# Altium footprint library biblioteka_pcb.PcbLib: 184 footprints (part 1 of 12)
Each footprint in its own frame and in the unit in brackets; x right, y up, seen from the top. Pads: shape width x height; smd on the part's side, far side on the other; paste and mask are expansions set on the pad; w line width, h text height; cw(c..) or ccw(c..) is an arc to the next point about the centre after c.
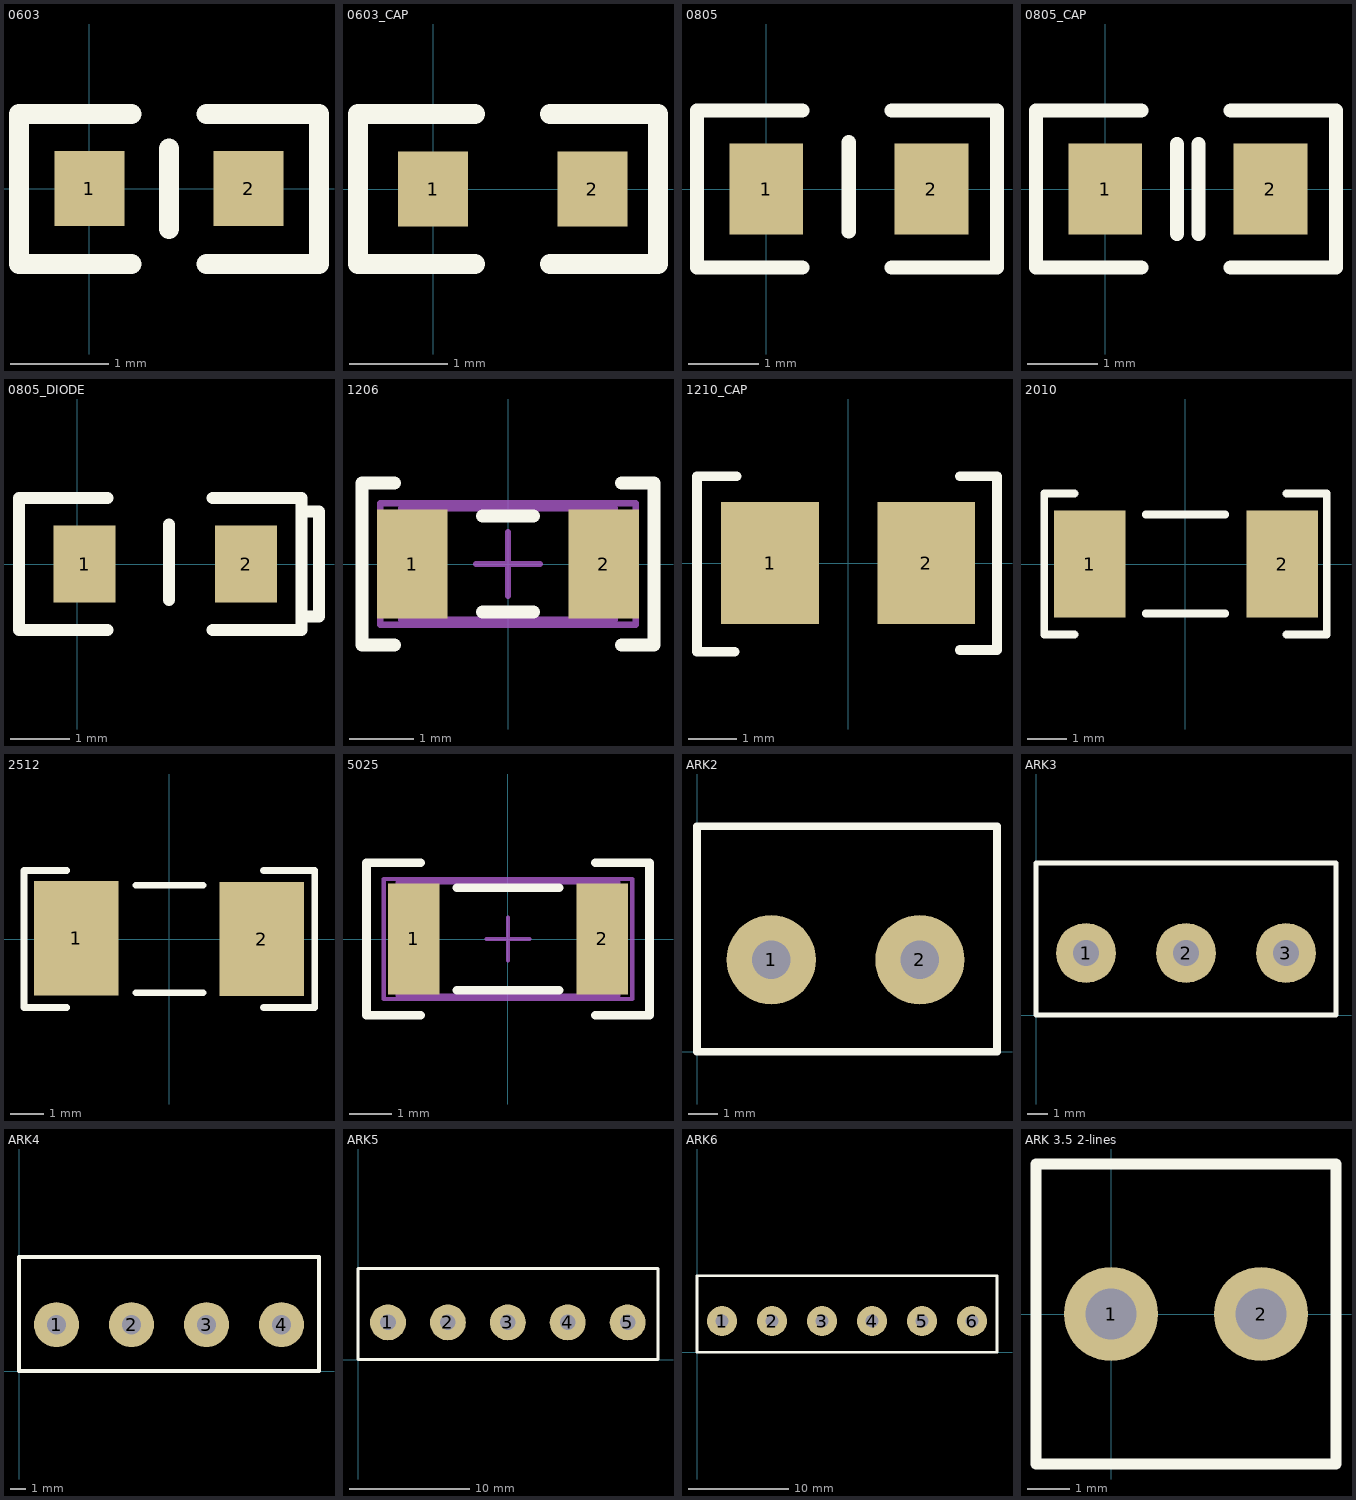
[diagram p0: the footprints below, top view; thin cyan lines are the x and y axes]

## 0603 [mil]
pads (2):
  rect 28x30 smd: 1(0,0) 2(63.78,0)
Top Overlay:
  lines w8: 16.89,-30.14 -28.11,-30.14 -28.11,29.86 16.89,29.86 ; 31.89,-16.14 31.89,16.14 ; 46.89,-30.14 91.89,-30.14 91.89,29.86 46.89,29.86
3D body "603.stp": height 31.89, standoff 0, extent 0,-16.14 63.78,16.14

## 0603_CAP [mil]
pads (2):
  rect 28x30 smd: 1(0,0) 2(63.78,0)
Top Overlay:
  lines w8: 16.89,-30 -30,-30 -30,30 16.89,30 ; 46.89,-30 90,-30 90,30 46.89,30
3D body "603_cap.stp": height 31.89, standoff 0, extent 0,-16.14 63.78,16.14

## 0805 [mm] "(2012 metric)"
height 0.7
pads (2):
  rect 1.05x1.3 smd: 1(0,0) 2(2.35,0)
Top Overlay:
  lines w0.203: 0.515,-1.118 -0.984,-1.118 -0.984,1.118 0.515,1.118 ; 1.175,-0.605 1.175,0.665 ; 1.785,-1.118 3.283,-1.118 3.283,1.118 1.785,1.118
3D body "805.stp": height 0.81, standoff 0, extent 0.152,-0.635 2.172,0.635

## 0805_CAP [mm]
pads (2):
  rect 1.05x1.3 smd: 1(0,0) 2(2.35,0)
Top Overlay:
  lines w0.203: 0.515,-1.118 -0.984,-1.118 -0.984,1.118 0.515,1.118 ; 1.023,-0.635 1.023,0.635 ; 1.327,-0.635 1.327,0.635 ; 1.785,-1.118 3.283,-1.118 3.283,1.118 1.785,1.118
3D body "Cap_0805.stp": height 0.9, standoff 0, extent 0.175,-0.605 2.175,0.635

## 0805_DIODE [mm]
pads (2):
  rect 1.05x1.3 smd: 1(0.127,0) 2(2.858,0)
Top Overlay:
  lines w0.203: 0.515,-1.118 -0.984,-1.118 -0.984,1.118 0.515,1.118 ; 1.556,-0.605 1.556,0.665 ; 2.293,-1.118 3.791,-1.118 3.791,1.118 2.293,1.118 ; 3.791,-0.889 4.089,-0.889 4.089,0.889 3.791,0.889
3D body "805.stp": height 0.81, standoff 0, extent 0.406,-0.635 2.426,0.635

## 1206 [mm] "3216(metric)"
height 2.54
pads (2):
  rect 1.1x1.7 smd: 1(-1.499,0) 2(1.499,0)
Top Overlay:
  lines w0.2: -1.778,-1.27 -2.286,-1.27 -2.286,1.27 -1.778,1.27 ; -0.4,-0.75 0.4,-0.75 ; -0.4,0.75 0.4,0.75 ; 1.778,-1.27 2.286,-1.27 2.286,1.27 1.778,1.27
Mechanical 13:
  lines w0.1: -1.675,-0.875 -1.675,0.875 1.675,0.875 1.675,-0.875 -1.675,-0.875
Mechanical 15:
  lines w0.1: -0.5,0 0.5,0 ; 0,-0.5 0,0.5 ; -2,-0.95 -2,0.95 2,0.95 2,-0.95 -2,-0.95
3D body "1206.stp": height 0.81, standoff 0, extent -1.61,-0.813 1.61,0.807

## 1210_CAP [mm]
pads (2):
  rect 2x2.5 smd: 1(-1.6,0) 2(1.6,0)
Top Overlay:
  lines w0.2: -2.322,-1.814 -3.096,-1.814 -3.096,1.778 -2.286,1.778 ; 2.286,-1.778 3.048,-1.778 3.048,1.778 2.286,1.778
3D body "1210_CAP.stp": height 1.01, standoff 0, extent -1.686,-1.24 1.534,1.28

## 2010 [mm] "Chip Resistor; Body 5 x 2.5 mm (LxW typ)"
height 0.7
pads (2):
  rect 1.8x2.7 smd: 1(-2.413,0) 2(2.438,0)
Top Overlay:
  lines w0.2: -2.794,-1.778 -3.556,-1.778 -3.556,1.778 -2.794,1.778 ; -1,-1.25 1,-1.25 ; -1,1.25 1,1.25 ; 2.54,-1.778 3.556,-1.778 3.556,1.778 2.54,1.778
3D body "2010.stp": height 0.81, standoff 0, extent -2.51,-1.27 2.51,1.25

## 2512 [mm] "Chip Resistor; Body 6.4 x 3.2 mm (LxW typ)"
height 1.2
pads (2):
  rect 2.5x3.4 smd: 1(-2.769,0.025) 2(2.743,0)
Top Overlay:
  lines w0.2: -3.048,-2.032 -4.318,-2.032 -4.318,2.032 -3.048,2.032 ; -1,-1.6 1,-1.6 ; -1,1.6 1,1.6 ; 2.794,-2.032 4.318,-2.032 4.318,2.032 2.794,2.032
3D body "2512.stp": height 0.81, standoff 0, extent -3.185,-1.521 3.185,1.499

## 5025 [mm] "2010 IMPERIAL"
pads (2):
  rect 1.2x2.6 smd: 1(-2.2,0) 2(2.2,0)
Top Overlay:
  lines w0.2: -2.032,-1.778 -3.302,-1.778 -3.302,1.778 -2.032,1.778 ; -1.2,-1.2 1.2,-1.2 ; -1.2,1.2 1.2,1.2 ; 2.032,-1.778 3.302,-1.778 3.302,1.778 2.032,1.778
Mechanical 13:
  lines w0.1: -2.575,-1.325 2.575,-1.325 2.575,1.325 -2.575,1.325 -2.575,-1.325
Mechanical 15:
  lines w0.1: -0.5,0 0.5,0 ; 0,-0.5 0,0.5 ; -2.9,-1.4 2.9,-1.4 2.9,1.4 -2.9,1.4 -2.9,-1.4
3D body: height 0.9, standoff 0, extent -2.575,-1.325 2.575,1.325

## ARK2 [mm]
pads (2):
  round 3 hole 1.3: 1(2.5,3.1) 2(7.5,3.1)
Top Overlay:
  lines w0.254: 0,0 10.098,0 10.098,7.6 0,7.6 0,0
3D body "ARK2.stp": height 10, standoff 0, extent 0,0 10,7.6

## ARK3 [mm]
pads (3):
  round 3 hole 1.3: 1(2.5,3.1) 2(7.5,3.1) 3(12.5,3.1)
Top Overlay:
  lines w0.254: 0,0 0,7.6 15,7.6 15,0 0,0
3D body "ARK3.stp": height 10, standoff 0, extent 0,0 15,7.6

## ARK4 [mm]
pads (4):
  round 3 hole 1.3: 1(2.5,3.1) 2(7.5,3.1) 3(12.5,3.1) 4(17.5,3.1)
Top Overlay:
  lines w0.254: 0,0 0,7.62 5,7.62 10,7.62 15,7.62 20,7.62 20,0 15,0 10,0 5,0 0,0
3D body "ARK4.stp": height 10, standoff 0, extent 0,0 20,7.6

## ARK5 [mm]
pads (5):
  round 3 hole 1.3: 1(2.5,3.1) 2(7.5,3.1) 3(12.5,3.1) 4(17.5,3.1) 5(22.5,3.1)
Top Overlay:
  lines w0.254: 0,0 0,7.6 25.033,7.6 25.033,0 0,0
3D body "ARK5.stp": height 10, standoff 0, extent 0,0 25,7.6

## ARK6 [mm]
pads (6):
  round 3 hole 1.3: 1(2.5,3.1) 2(7.5,3.1) 3(12.5,3.1) 4(17.5,3.1) 5(22.5,3.1) 6(27.5,3.1)
Top Overlay:
  lines w0.254: 0,0 0,7.62 5,7.62 10,7.62 15,7.62 20,7.62 25,7.62 30,7.62 30,0 25,0 20,0 15,0 10,0 5,0 0,0
3D body "ARK6.stp": height 10, standoff 0, extent 0,0 30,7.6

## ARK 3.5 2-lines [mm]
pads (2):
  round 2.2 hole 1.2: 1(0,0) 2(3.5,0)
Top Overlay:
  lines w0.254: -1.75,-3.5 -1.75,3.5 5.25,3.5 5.25,-3.5 -1.75,-3.5